# Altium footprint library Amirreza.PcbLib: 524 footprints (part 11 of 33)
Each footprint in its own frame and in the unit in brackets; x right, y up, seen from the top. Pads: shape width x height; smd on the part's side, far side on the other; paste and mask are expansions set on the pad; w line width, h text height; cw(c..) or ccw(c..) is an arc to the next point about the centre after c.
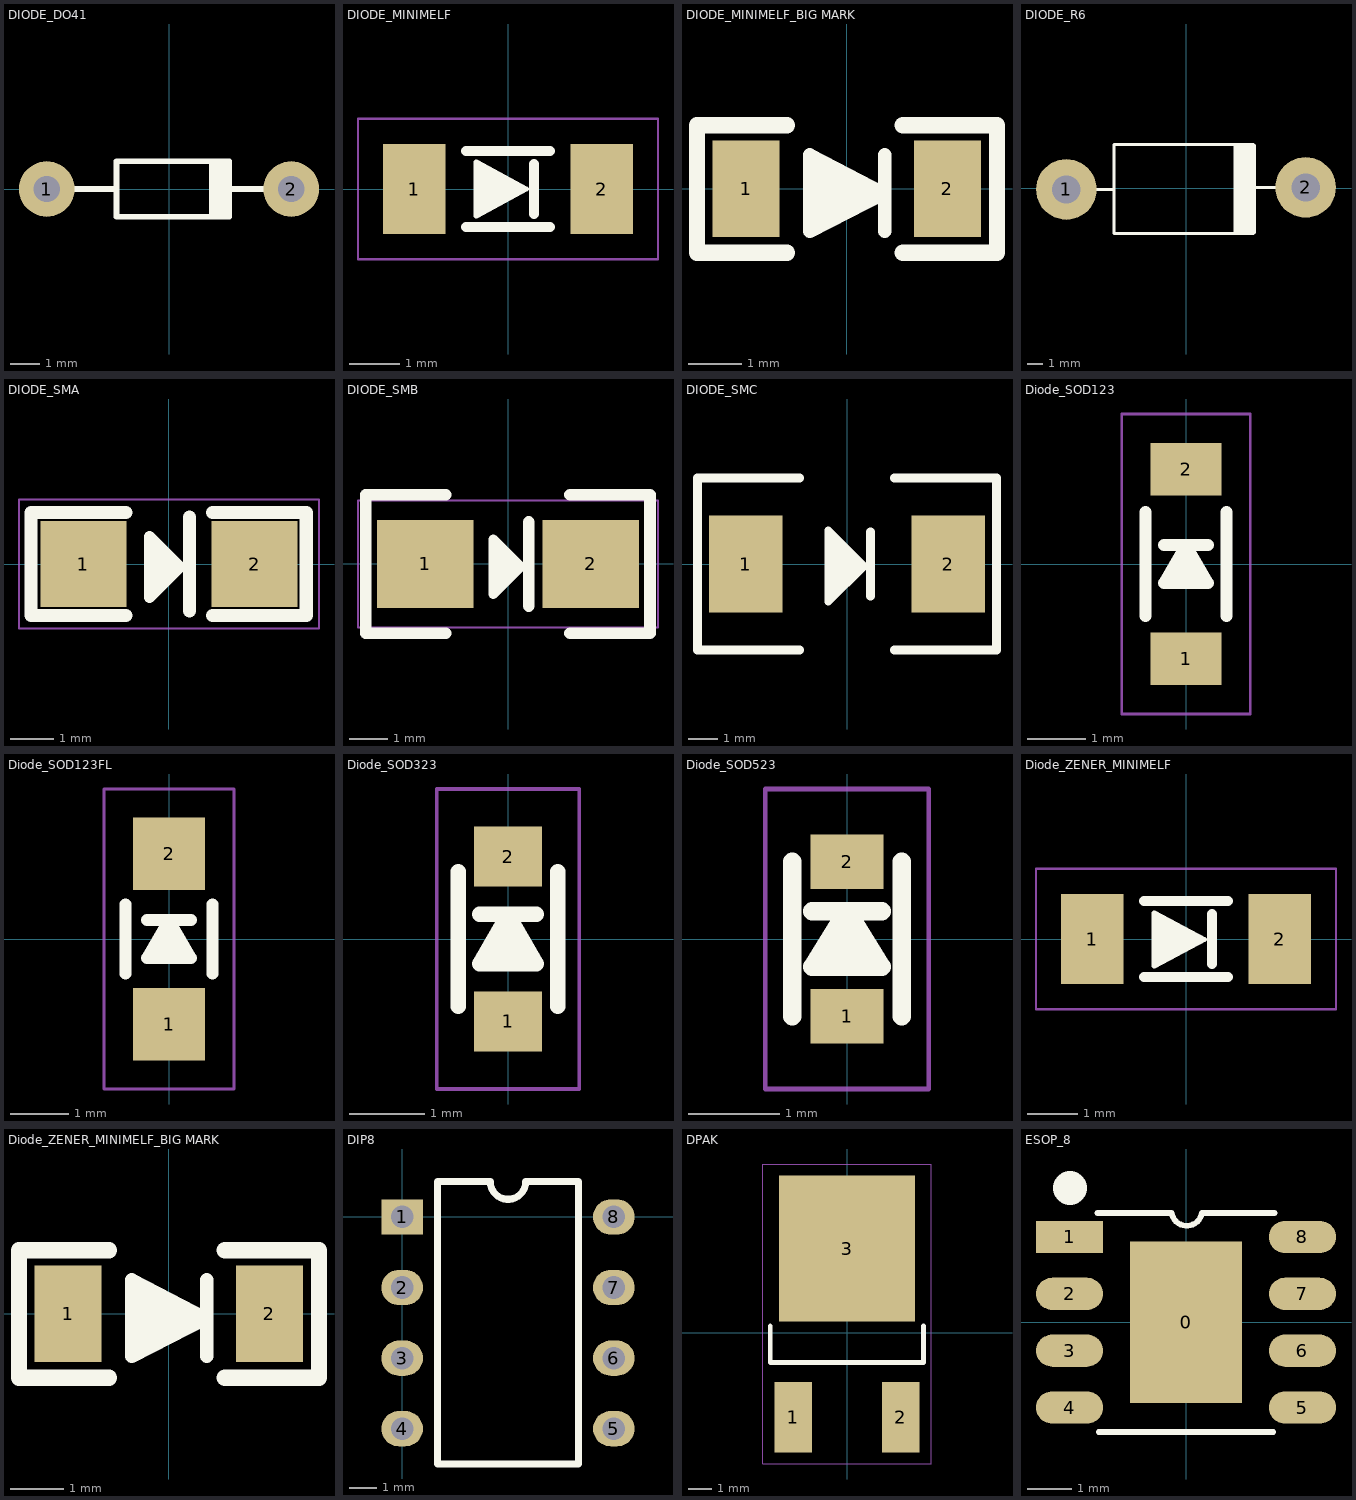
[diagram p10: the footprints below, top view; thin cyan lines are the x and y axes]

## DIODE_DO41 [mm]
pads (2):
  round 1.905 hole 0.9: 1(-4.185,0) 2(4.185,0)
Top Overlay:
  rectangle: 1.364,-0.95 2.164,0.95
  lines w0.2: -4.185,0 -1.874,0 ; 1.955,0 4.185,0 ; 2.064,-0.95 -1.803,-0.95 -1.803,0.95 2.064,0.95
3D body "User Library-DO-41G-30.step": height 2.52, standoff -2, extent -4.2,-1.201 4.2,1.201

## DIODE_MINIMELF [mm]
pads (2):
  rect 1.25x1.8 smd: 1(-1.875,0) 2(1.875,0)
Top Overlay:
  region: -0.635,0.522 -0.635,-0.01 0.372,-0.01
  region: -0.635,-0.542 -0.635,-0.01 0.372,-0.01
  lines w0.1: -0.635,-0.542 0.372,0 -0.635,0.542 -0.635,-0.542
  lines w0.2: -0.838,-0.762 0.838,-0.762 ; -0.838,0.762 0.838,0.762 ; 0.52,-0.496 0.52,0.496
Mechanical 13:
  lines w0.05: -3,-1.4 3,-1.4 3,1.4 -3,1.4 -3,-1.4
3D body "User Library-MiniMelf-2.step": height 1.6, standoff 0, extent -1.82,-0.8 1.88,0.8

## DIODE_MINIMELF_BIG MARK [mm]
pads (2):
  rect 1.25x1.8 smd: 1(-1.875,0) 2(1.875,0)
Top Overlay:
  rectangle: -0.692,-0.489 -0.099,0.372
  region: -0.757,-0.423 -0.581,-0.749 0.458,-0.189 0.282,0.136
  region: -0.594,0.668 -0.783,0.399 0.182,-0.279 0.372,-0.01
  rectangle: -0.692,-0.187 0.456,0.036
  lines w0.254: 0.705,-0.791 0.705,0.63 ; -0.692,-0.791 -0.692,0.63 0.691,-0.085 -0.692,-0.791
  lines w0.305: -2.789,-1.19 -1.113,-1.19 ; -2.789,-1.143 -2.789,1.185 -1.113,1.185 ; 1.046,-1.19 2.799,-1.19 ; 1.046,1.185 2.799,1.185 2.799,-1.143
3D body "User Library-MiniMelf-2.step": height 1.6, standoff 0, extent -1.82,-0.8 1.88,0.8

## DIODE_R6 [mil]
pads (2):
  round 150 hole 70: 1(-296.06,-2.5) 2(296.06,2.5)
Top Overlay:
  rectangle: 116.94,-111.5 173.43,108.97
  lines w7.87: -296.06,-2.5 -178.06,-2.5 ; 166.06,2.5 296.06,2.5 ; 166.94,-111.74 -178.06,-111.74 -178.06,108.74 166.94,108.74
3D body "User Library-Diode R-6 diameter 9_1 pitch 600mils.step": height 360.63, standoff -218.5, extent -325.59,-179.52 325.59,179.53

## DIODE_SMA [mm]
pads (2):
  rect 2x2 smd: 1(-1.99,0) 2(1.99,0)
Top Overlay:
  rectangle: -0.07,-0.253 0.259,0.076
  rectangle: -0.451,-0.479 0.017,0.33
  lines w0.254: -0.451,-0.782 0.259,-0.071 -0.451,0.639 -0.451,-0.782
  lines w0.305: -0.999,-1.194 -3.209,-1.194 -3.209,1.198 -0.999,1.198 ; 0.474,-1.092 0.474,1.092 ; 1.008,-1.194 3.192,-1.194 3.192,1.198 1.008,1.198
Mechanical 13:
  lines w0.05: -3.49,-1.5 -3.49,1.5 3.49,1.5 3.49,-1.5 -3.49,-1.5
3D body "User Library-DO-214AC SMA.step": height 2.45, standoff 0.05, extent -2.6,-1.3 2.6,1.3

## DIODE_SMB [mm]
pads (2):
  rect 2.5x2.3 smd: 1(-2.15,0) 2(2.15,0)
Top Overlay:
  rectangle: -0.002,-0.253 0.327,0.076
  rectangle: -0.383,-0.479 0.085,0.33
  lines w0.254: -0.383,-0.782 0.327,-0.071 -0.383,0.639 -0.383,-0.782
  lines w0.305: -1.617,-1.8 -3.699,-1.8 -3.699,1.8 -1.617,1.8 ; 0.542,-1.092 0.542,1.092 ; 1.61,-1.8 3.692,-1.8 3.692,1.8 1.61,1.8
Mechanical 13:
  lines w0.05: -3.9,-1.65 3.9,-1.65 ; -3.9,-1.65 -3.9,1.65 ; -3.9,-1.65 -3.9,1.65 ; -3.9,-1.65 3.9,-1.65 ; -3.9,1.65 3.9,1.65 ; -3.9,1.65 3.9,1.65 ; 3.9,-1.65 3.9,1.65 ; 3.9,-1.65 3.9,1.65
3D body "User Library-DO-214AA SMB.step": height 2.35, standoff 0.05, extent -2.7,-1.8 2.7,1.8

## DIODE_SMC [mm]
pads (2):
  rect 2.5x3.3 smd: 1(-3.45,0) 2(3.45,0)
Top Overlay:
  rectangle: 0.252,-0.253 0.581,0.076
  rectangle: -0.635,-0.479 0.339,0.33
  lines w0.254: -0.635,-1.288 0.581,-0.071 -0.635,1.145 ; -0.635,-1.27 -0.635,1.143
  lines w0.305: -1.617,-2.921 -5.08,-2.921 -5.08,2.921 -1.617,2.921 ; 0.796,-1.092 0.796,1.092 ; 1.617,-2.921 5.08,-2.921 5.08,2.921 1.617,2.921
  lines w0.508: -0.508,-0.762 0,-0.254 ; -0.508,0.635 0.127,0
3D body "User Library-DO-214AB SMC.step": height 2.3, standoff 0, extent -3.975,-2.95 3.975,2.95

## Diode_SOD123 [mm]
pads (2):
  rect 1.22x0.91 smd: 1(0,-1.635) 2(0,1.635)
Top Overlay:
  region: 0,0.33 0,-0.33 0.381,-0.33
  region: 0,0.33 0,-0.33 -0.381,-0.33
  lines w0.203: -0.7,-0.9 -0.7,0.9 ; -0.381,0.33 0.381,0.33 ; 0.7,-0.9 0.7,0.9 ; -0.381,-0.33 0.381,-0.33 0,0.33 -0.381,-0.33
Mechanical 13:
  lines w0.05: -1.11,-2.59 1.11,-2.59 1.11,2.59 -1.11,2.59 -1.11,-2.59
3D body "User Library-SOD-123.step": height 1.25, standoff 0, extent -0.8,-1.849 0.8,1.849

## Diode_SOD123FL [mm]
pads (2):
  rect 1.25x1.25 smd: 1(0,-1.475) 2(0,1.475)
Top Overlay:
  region: 0,0.33 0,-0.33 -0.381,-0.33
  region: 0,0.33 0,-0.33 0.381,-0.33
  lines w0.203: -0.75,-0.6 -0.75,0.6 ; -0.381,0.33 0.381,0.33 ; 0.75,-0.6 0.75,0.6 ; -0.381,-0.33 0,0.33 0.381,-0.33 -0.381,-0.33
Mechanical 13:
  lines w0.05: -1.125,-2.59 -1.125,2.59 1.125,2.59 1.125,-2.59 -1.125,-2.59
3D body "User Library-SOD-123FL.step": height 0.95, standoff 0.01, extent -0.825,-1.794 0.825,1.794

## Diode_SOD323 [mm]
pads (2):
  rect 0.9x0.8 smd: 1(0,-1.1) 2(0,1.1)
Top Overlay:
  region: 0,0.33 0,-0.33 0.381,-0.33
  region: 0,0.33 0,-0.33 -0.381,-0.33
  lines w0.203: -0.662,-0.9 -0.662,0.9 ; -0.381,0.33 0.381,0.33 ; 0.662,-0.9 0.662,0.9 ; -0.381,-0.33 0.381,-0.33 0,0.33 -0.381,-0.33
Mechanical 13:
  lines w0.05: -0.95,-2 -0.95,2 ; -0.95,-2 0.95,-2 ; -0.95,-2 0.95,-2 ; -0.95,-2 -0.95,2 ; -0.95,2 0.95,2 ; -0.95,2 0.95,2 ; 0.95,-2 0.95,2 ; 0.95,-2 0.95,2
3D body "User Library-SOD323F-1.step": height 1.03, standoff 0.03, extent -0.675,-1.25 0.675,1.25

## Diode_SOD523 [mm]
pads (2):
  rect 0.8x0.6 smd: 1(0,-0.85) 2(0,0.85)
Top Overlay:
  region: 0,0.318 0,-0.342 -0.381,-0.342
  region: 0,0.318 0,-0.342 0.381,-0.342
  lines w0.203: -0.6,-0.85 -0.6,0.85 ; -0.381,0.306 0.381,0.306 ; 0.6,-0.85 0.6,0.85 ; -0.381,-0.306 0.381,-0.306 0,0.306 -0.381,-0.306
Mechanical 13:
  lines w0.05: -0.9,-1.65 -0.9,1.65 ; -0.9,-1.65 0.9,-1.65 ; -0.9,-1.65 -0.9,1.65 ; -0.9,1.65 0.9,1.65 ; 0.9,-1.65 0.9,1.65 ; 0.9,-1.65 0.9,1.65
3D body "User Library-SOD-523F.step": height 0.7, standoff 0, extent -0.399,-0.8 0.399,0.8

## Diode_ZENER_MINIMELF [mm]
pads (2):
  rect 1.25x1.8 smd: 1(-1.875,0) 2(1.875,0)
Top Overlay:
  region: -0.635,-0.542 -0.635,-0.01 0.372,-0.01
  region: -0.635,0.522 -0.635,-0.01 0.372,-0.01
  lines w0.1: -0.635,-0.542 -0.635,-0.01 -0.635,0.522 0.372,-0.01 -0.635,-0.542
  lines w0.2: -0.838,-0.762 0.838,-0.762 ; -0.838,0.762 0.838,0.762 ; 0.52,-0.496 0.52,0.499
Mechanical 13:
  lines w0.05: -3,-1.4 -3,1.4 3,1.4 3,-1.4 -3,-1.4
3D body "User Library-SOD80C-1.STEP": height 1.61, standoff 0.01, extent -1.825,-0.813 1.875,0.787

## Diode_ZENER_MINIMELF_BIG MARK [mm]
pads (2):
  rect 1.25x1.8 smd: 1(-1.875,0) 2(1.875,0)
Top Overlay:
  rectangle: -0.692,-0.187 0.456,0.036
  region: -0.594,0.668 -0.783,0.399 0.182,-0.279 0.372,-0.01
  region: -0.757,-0.423 -0.581,-0.749 0.458,-0.189 0.282,0.136
  rectangle: -0.692,-0.489 -0.099,0.372
  lines w0.254: 0.705,-0.791 0.705,0.63 ; -0.692,-0.791 0.691,-0.085 -0.692,0.63 -0.692,-0.791
  lines w0.305: -2.789,-1.19 -1.113,-1.19 ; -2.789,-1.143 -2.789,1.185 -1.113,1.185 ; 1.046,-1.19 2.799,-1.19 ; 1.046,1.185 2.799,1.185 2.799,-1.143
3D body "User Library-SOD80C-1.STEP": height 1.61, standoff 0.01, extent -1.825,-0.813 1.875,0.787

## DIP8 [mm]
pads (8):
  rect 1.5x1.27 hole 0.813: 1(0,0)
  oval 1.5x1.27 hole 0.813: 2(0,-2.54) 3(0,-5.08) 4(0,-7.62) 5(7.62,-7.62) 6(7.62,-5.08) 7(7.62,-2.54) 8(7.62,0)
Top Overlay:
  lines w0.254: 1.27,-8.89 6.35,-8.89 6.35,1.27 4.445,1.27 cw(c3.81,1.27) 3.175,1.27 1.27,1.27 1.27,-8.89

## DPAK [mm]
pads (3):
  rect 1.6x3 smd: 1(-2.285,-3.59) 2(2.285,-3.59)
  rect 5.8x6.2 smd: 3(0,3.59)
Top Overlay:
  lines w0.2: -3.268,0.288 -3.268,-1.27 3.259,-1.27 3.259,0.288
Mechanical 13:
  lines w0.05: -3.585,-5.59 3.585,-5.59 3.585,7.19 -3.585,7.19 -3.585,-5.59
3D body "User Library-TO-255AA-1.step": height 2.39, standoff 0, extent -3.365,-4.445 3.365,6.002

## ESOP_8 [mm]
pads (9):
  rect 2.5x3.6 smd: 0(0,0)
  rect 1.5x0.72 smd: 1(-2.6,1.905)
  oval 1.5x0.72 smd: 2(-2.6,0.635) 3(-2.6,-0.635) 4(-2.6,-1.905) 5(2.6,-1.905) 6(2.6,-0.635) 7(2.6,0.635) 8(2.6,1.905)
Top Overlay:
  circle w0.7: c-2.591,2.997 r0.025
  lines w0.127: -1.975,2.438 -0.322,2.438 ccw(c0.017,2.498) 0.356,2.438 1.975,2.438 ; -1.95,-2.45 1.95,-2.45
3D body "CircuitWorks-SO-8.STEP": height 1.45, standoff 0, extent -2.889,-2.464 2.889,2.438